# Altium footprint library PcbLib1.PcbLib: 157 footprints (part 6 of 10)
Each footprint in its own frame and in the unit in brackets; x right, y up, seen from the top. Pads: shape width x height; smd on the part's side, far side on the other; paste and mask are expansions set on the pad; w line width, h text height; cw(c..) or ccw(c..) is an arc to the next point about the centre after c.
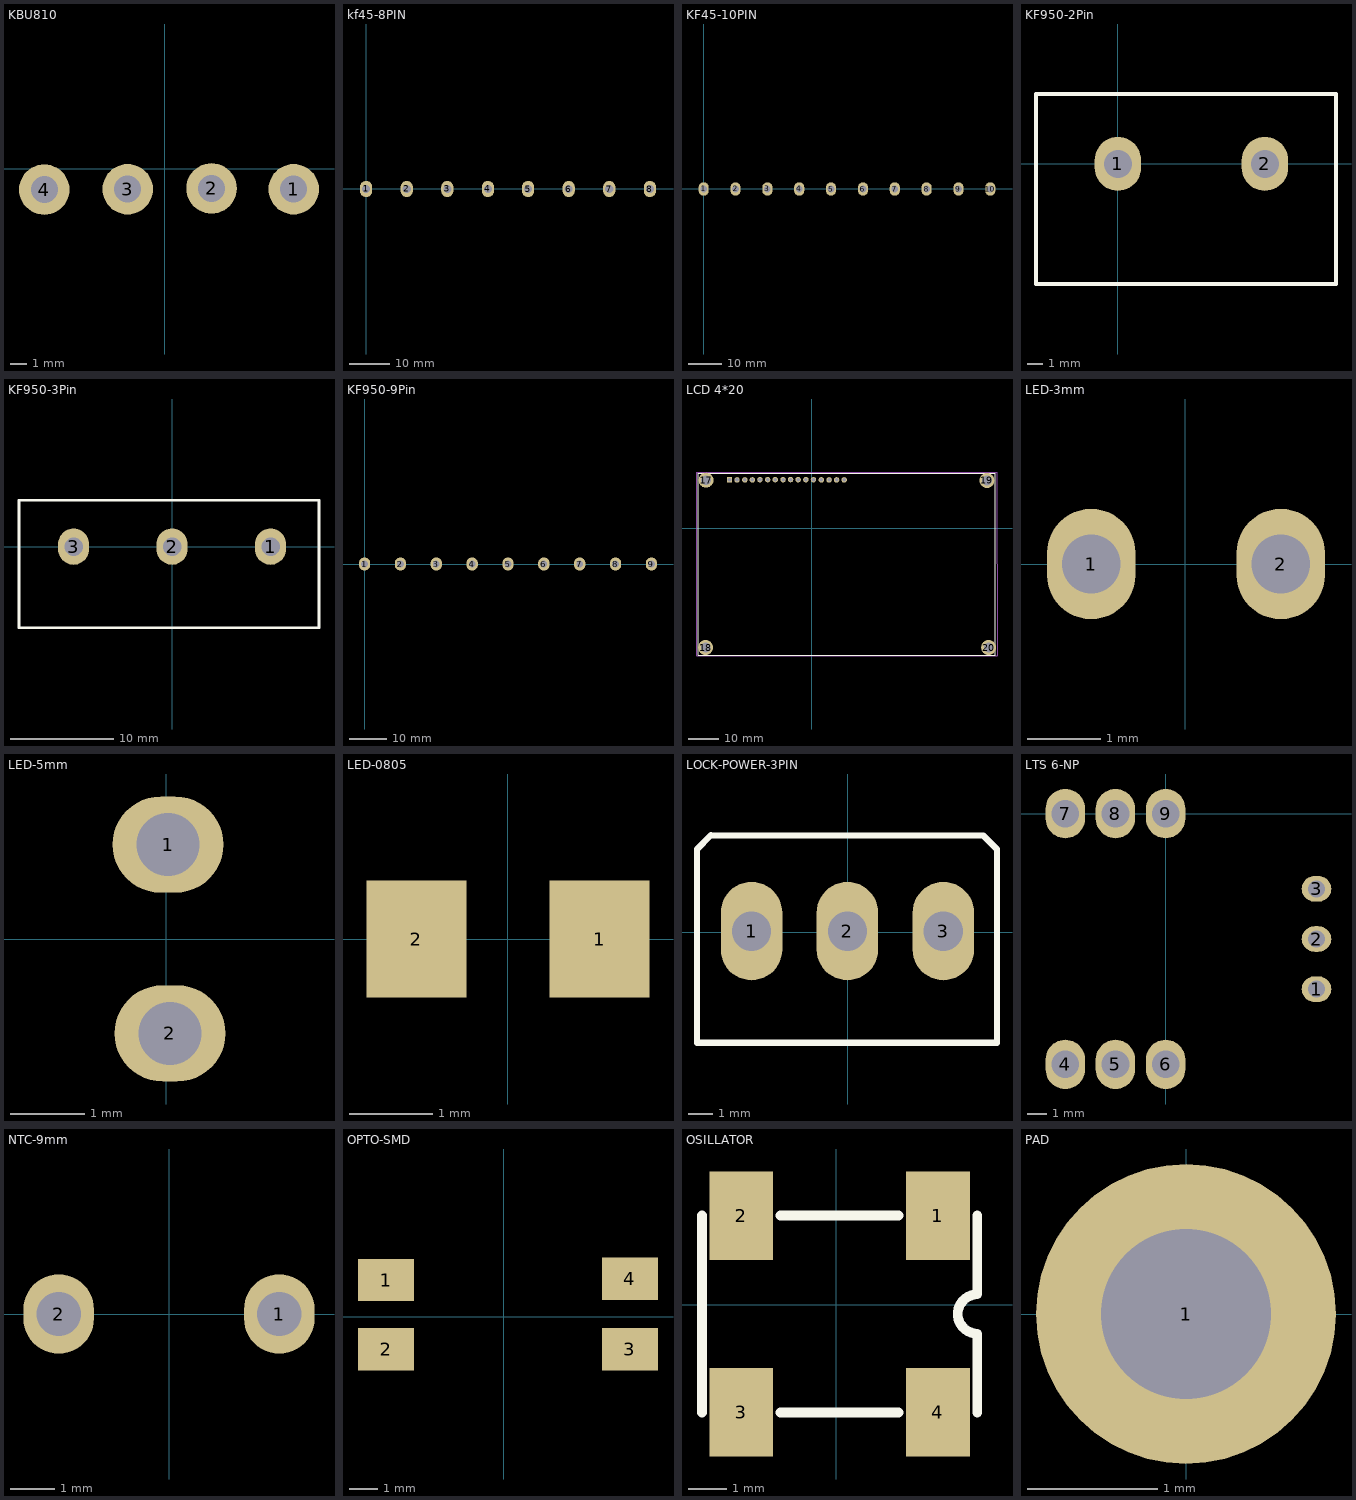
[diagram p5: the footprints below, top view; thin cyan lines are the x and y axes]

## KBU810 [mm]
pads (4):
  round 3 hole 1.6: 1(7.65,-1.225) 2(2.775,-1.175) 3(-2.2,-1.225) 4(-7.15,-1.25)
3D body "User Library-KBU80X.STEP": height 19.9, standoff -7.9, extent -11.75,-2.95 11.95,3.76

## kf45-8PIN [mm]
pads (8):
  oval 3x4 hole 2: 1(0,0) 2(10,0) 3(20,0) 4(30,0) 5(39.9,0) 6(49.9,0) 7(59.9,0) 8(69.9,0)
3D body "User Library-Terminal_Block.STEP": height 18.64, standoff -4.86, extent 33.925,-7.75 55.925,7.75
3D body "User Library-Terminal_Block.STEP": height 18.64, standoff -4.86, extent 53.85,-7.75 75.85,7.75
3D body "User Library-Terminal_Block.STEP": height 18.64, standoff -4.86, extent 13.95,-7.75 35.95,7.75
3D body "User Library-Terminal_Block.STEP": height 18.64, standoff -4.86, extent -5.975,-7.75 16.025,7.75

## KF45-10PIN [mm]
pads (10):
  oval 3x4 hole 2: 1(0,0) 2(9.5,0) 3(19,0) 4(28.5,0) 5(38,0) 6(47.5,0) 7(57,0) 8(66.5,0) 9(76,0) 10(85.5,0)
3D body "User Library-Terminal_Block.STEP": height 18.64, standoff -4.86, extent 69.175,-7.775 91.175,7.725
3D body "User Library-Terminal_Block.STEP": height 18.64, standoff -4.86, extent -5.975,-7.75 16.025,7.75
3D body "User Library-Terminal_Block.STEP": height 18.64, standoff -4.86, extent 12.85,-7.775 34.85,7.725
3D body "User Library-Terminal_Block.STEP": height 18.64, standoff -4.86, extent 50.15,-7.75 72.15,7.75
3D body "User Library-Terminal_Block.STEP": height 18.64, standoff -4.86, extent 31.55,-7.75 53.55,7.75

## KF950-2Pin [mm]
pads (2):
  oval 3x3.5 hole 1.8: 1(0,0) 2(9.52,0)
Top Overlay:
  lines w0.254: -5.3,-7.775 14.125,-7.775 14.125,4.525 -5.3,4.525 -5.3,-7.775
3D body "70054429.stp": height 21.5, standoff -5, extent -5.385,-7.9 14.225,4.6

## KF950-3Pin [mm]
pads (3):
  oval 3x3.5 hole 1.8: 1(9.52,0) 2(0,0) 3(-9.52,0)
Top Overlay:
  lines w0.254: -14.8,-7.85 -14.8,4.5 14.2,4.5 14.2,-7.85 -14.8,-7.85
3D body "70054430.stp": height 21.5, standoff -5, extent -14.855,-7.95 14.275,4.55

## KF950-9Pin [mm]
pads (9):
  oval 3x3.5 hole 1.8: 1(0,0) 2(9.52,0) 3(19.04,0) 4(28.56,0) 5(38.08,0) 6(47.6,0) 7(57.12,0) 8(66.64,0) 9(76.16,0)
3D body "70054430.stp": height 21.5, standoff -5, extent 51.825,-7.875 80.955,4.625
3D body "70054430.stp": height 21.5, standoff -5, extent 23.275,-7.875 52.405,4.625
3D body "70054430.stp": height 21.5, standoff -5, extent -5.29,-7.875 23.84,4.625

## LCD 4*20 [mm]
height 1.2
pads (20):
  rect 1.8x1.8 hole 1.2 mask+0: 1(-27.4,16.1)
  round 1.8 hole 1.2 mask+0: 2(-24.9,16) 3(-22.3,16) 4(-19.8,16) 5(-17.281,16.084) 6(-14.7,16.069) 7(-12.2,16.069) 8(-9.6,16.084) 9(-7.1,16.1) 10(-4.6,16.069) 11(-2,16.069) 12(0.5,16.069) 13(3.1,16) 14(5.7,16) 15(8.2,16) 16(10.7,16)
  round 5 hole 3.2 paste+0 mask+0: 17(-35.2,15.892) 18(-35.35,-39.7) 20(58.7,-39.7)
  round 5 hole 3.2 mask+0: 19(58.168,15.8)
Top Overlay:
  lines w0.127: -37.85,-42.2 61,-42.2 61,18.2 -37.85,18.2 -37.85,-42.2
Top Solder:
  region: 58.85,-37.633 58.466,-37.67 58.097,-37.782 57.757,-37.964 57.459,-38.209 57.214,-38.507 57.032,-38.847 56.92,-39.216 56.883,-39.6 56.92,-39.984 57.032,-40.353 57.214,-40.693 57.459,-40.991 57.757,-41.236 58.097,-41.418 58.466,-41.53 58.85,-41.567 59.234,-41.53 59.603,-41.418 59.943,-41.236 60.241,-40.991 60.486,-40.693 60.668,-40.353 60.78,-39.984 60.817,-39.6 60.78,-39.216 60.668,-38.847 60.486,-38.507 60.241,-38.209 59.943,-37.964 59.603,-37.782 59.234,-37.67
  region: 57.6,17.467 57.216,17.43 56.847,17.318 56.507,17.136 56.209,16.891 55.964,16.593 55.782,16.253 55.67,15.884 55.633,15.5 55.67,15.116 55.782,14.747 55.964,14.407 56.209,14.109 56.507,13.864 56.847,13.682 57.216,13.57 57.6,13.533 57.984,13.57 58.353,13.682 58.693,13.864 58.991,14.109 59.236,14.407 59.418,14.747 59.53,15.116 59.567,15.5 59.53,15.884 59.418,16.253 59.236,16.593 58.991,16.891 58.693,17.136 58.353,17.318 57.984,17.43
  region: -35.416,-37.619 -35.8,-37.657 -36.169,-37.769 -36.509,-37.951 -36.807,-38.195 -37.052,-38.493 -37.234,-38.834 -37.346,-39.203 -37.383,-39.586 -37.346,-39.97 -37.234,-40.339 -37.052,-40.68 -36.807,-40.978 -36.509,-41.222 -36.169,-41.404 -35.8,-41.516 -35.416,-41.554 -35.032,-41.516 -34.663,-41.404 -34.323,-41.222 -34.025,-40.978 -33.78,-40.68 -33.598,-40.339 -33.486,-39.97 -33.448,-39.586 -33.486,-39.203 -33.598,-38.834 -33.78,-38.493 -34.025,-38.195 -34.323,-37.951 -34.663,-37.769 -35.032,-37.657
Bottom Solder:
  region: 58.85,-37.633 58.466,-37.67 58.097,-37.782 57.757,-37.964 57.459,-38.209 57.214,-38.507 57.032,-38.847 56.92,-39.216 56.883,-39.6 56.92,-39.984 57.032,-40.353 57.214,-40.693 57.459,-40.991 57.757,-41.236 58.097,-41.418 58.466,-41.53 58.85,-41.567 59.234,-41.53 59.603,-41.418 59.943,-41.236 60.241,-40.991 60.486,-40.693 60.668,-40.353 60.78,-39.984 60.817,-39.6 60.78,-39.216 60.668,-38.847 60.486,-38.507 60.241,-38.209 59.943,-37.964 59.603,-37.782 59.234,-37.67
  region: 58.114,17.81 57.73,17.772 57.361,17.66 57.02,17.478 56.722,17.233 56.478,16.935 56.296,16.595 56.184,16.226 56.146,15.842 56.184,15.458 56.296,15.089 56.478,14.749 56.722,14.451 57.02,14.206 57.361,14.024 57.73,13.912 58.114,13.875 58.497,13.912 58.866,14.024 59.207,14.206 59.505,14.451 59.749,14.749 59.931,15.089 60.043,15.458 60.081,15.842 60.043,16.226 59.931,16.595 59.749,16.935 59.505,17.233 59.207,17.478 58.866,17.66 58.497,17.772
  region: -35.416,-37.806 -35.8,-37.844 -36.169,-37.956 -36.509,-38.138 -36.807,-38.382 -37.052,-38.681 -37.234,-39.021 -37.346,-39.39 -37.383,-39.774 -37.346,-40.158 -37.234,-40.527 -37.052,-40.867 -36.807,-41.165 -36.509,-41.41 -36.169,-41.591 -35.8,-41.703 -35.416,-41.741 -35.032,-41.703 -34.663,-41.591 -34.323,-41.41 -34.025,-41.165 -33.78,-40.867 -33.598,-40.527 -33.486,-40.158 -33.448,-39.774 -33.486,-39.39 -33.598,-39.021 -33.78,-38.681 -34.025,-38.382 -34.323,-38.138 -34.663,-37.956 -35.032,-37.844
Mechanical 1:
  lines w0.127: -38.2,-42.4 -38.2,18.5 61.5,18.5 61.5,-42.4 -38.2,-42.4
3D body "User Library-LCD2004.STEP": height 31.05, standoff 19, extent -37.434,-41.882 60.567,18.118

## LED-3mm [mm]
pads (2):
  oval 1.2x1.5 hole 0.8: 1(-1.275,0) 2(1.3,0)
3D body "User Library-led3mm-red.STEP": height 5.4, standoff -1.8, extent -1.52,-1.45 1.52,1.45

## LED-5mm [mm]
pads (2):
  oval 1.5x1.3 hole 0.85: 1(0.025,1.275) 2(0.05,-1.275)
3D body "User Library-led5mm-red.STEP": height 9.6, standoff -1.8, extent -2.948,-2.501 2.948,2.95

## LED-0805 [mm]
pads (2):
  rect 1.2x1.4 smd: 1(1.1,0) 2(-1.1,0)
3D body "User Library-User Library-led_0805 GRE.STEP": height 1.1, standoff 0, extent -1.035,-0.625 0.985,0.625

## LOCK-POWER-3PIN [mm]
pads (3):
  oval 2.5x4 hole 1.6: 1(-3.907,0.042) 2(-0.007,0.042) 3(3.893,0.042)
Top Overlay:
  lines w0.254: -5.558,3.942 -6.125,3.375 -6.125,-4.5 6.075,-4.5 6.075,3.375 5.525,3.925 -5.541,3.925
3D body "User Library-B3P-VH.STEP": height 10.9, standoff -3.7, extent -5.935,-4.55 5.885,3.95

## LTS 6-NP [mm]
pads (9):
  oval 1.5x1.3 hole 0.85: 1(7.645,-8.89) 2(7.645,-6.35) 3(7.645,-3.81)
  oval 2x2.5 hole 1.4: 4(-5.08,-12.7) 5(-2.54,-12.7) 6(0,-12.7) 7(-5.08,0) 8(-2.54,0) 9(0,0)
3D body "LTS6_NP.stp": height 24, standoff -3.5, extent -12.7,-13.081 9.5,0.419

## NTC-9mm [mm]
pads (2):
  oval 1.6x1.8 hole 1: 1(2.5,0) 2(-2.5,0)
3D body "User Library-B57153.STEP": height 21.5, standoff -10, extent -7.525,-2.975 7.475,3.025

## OPTO-SMD [mm]
pads (4):
  rect 2x1.5 smd: 1(-4.2,1.3) 2(-4.2,-1.164) 3(4.5,-1.164) 4(4.5,1.351)
3D body "User Library-PC817_Gullwing.STEP": height 3.85, standoff 0, extent -4.875,-2.215 5.125,2.365

## OSILLATOR [mil] "SMD"
height 47.24
pads (4):
  rect 65x90 smd: 1(103.28,90.74) 2(-96.72,90.74) 3(-96.72,-109.26) 4(103.28,-109.26)
Top Overlay:
  lines w10: -136.72,-109.26 -136.72,90.74 ; -56.72,-109.26 63.28,-109.26 ; -56.72,90.74 63.28,90.74 ; 143.28,-109.26 143.28,-29.26 cw(c143.28,-9.26) 143.28,10.74 143.28,90.74
3D body "User Library-ASV-Oscil.STEP": height 70.87, standoff 0, extent -133.22,-110.26 142.37,89.74

## PAD [mm]
pads (1):
  round 2.3 hole 1.3: 1(0,0)